# Altium schematic symbol library FPGA_Xilinx_Virtex6.SchLib: 28 symbols (part 1 of 21) (continued)
## XC6VHX255T-FF1155 (continued)
part G pins: AD29 MGTRXN3_104 (io), AD30 MGTRXP3_104 (io), AD33 MGTTXN3_104 (io), AD34 MGTTXP3_104 (io), AE27 MGTREFCLK1P_104 (io), AE28 MGTREFCLK1N_104 (io), AE31 MGTRXN2_104 (io), AE32 MGTRXP2_104 (io), AF29 MGTRXN1_104 (io), AF30 MGTRXP1_104 (io), AF33 MGTTXN2_104 (io), AF34 MGTTXP2_104 (io), AG27 MGTREFCLK0P_104 (io), AG28 MGTREFCLK0N_104 (io), AG31 MGTRXN0_104 (io), AG32 MGTRXP0_104 (io), AH29 MGTRXN3_103 (io), AH30 MGTRXP3_103 (io), AH33 MGTTXN1_104 (io), AH34 MGTTXP1_104 (io), AJ27 MGTREFCLK1P_103 (io), AJ28 MGTREFCLK1N_103 (io), AJ31 MGTRXN2_103 (io), AJ32 MGTRXP2_103 (io), AK29 MGTRXN1_103 (io), AK30 MGTRXP1_103 (io), AK33 MGTTXN0_104 (io), AK34 MGTTXP0_104 (io), AL27 MGTREFCLK0P_103 (io), AL28 MGTREFCLK0N_103 (io), AL31 MGTTXN3_103 (io), AL32 MGTTXP3_103 (io), AM29 MGTRXN0_103 (io), AM30 MGTRXP0_103 (io), AM33 MGTTXN2_103 (io), AM34 MGTTXP2_103 (io), AN31 MGTTXN1_103 (io), AN32 MGTTXP1_103 (io), AP33 MGTTXN0_103 (io), AP34 MGTTXP0_103 (io)
part H pins: AA27 MGTREFCLK1P_105 (io), AA28 MGTREFCLK1N_105 (io), AA31 MGTRXN3_105 (io), AA32 MGTRXP3_105 (io), AB29 MGTRXN2_105 (io), AB30 MGTRXP2_105 (io), AB33 MGTTXN0_105 (io), AB34 MGTTXP0_105 (io), AC27 MGTREFCLK0P_105 (io), AC28 MGTREFCLK0N_105 (io), AC31 MGTRXN0_105 (io), AC32 MGTRXP0_105 (io), AH5 MGTRXP3_113 (io), AH6 MGTRXN3_113 (io), AJ3 MGTRXP2_113 (io), AJ4 MGTRXN2_113 (io), AJ7 MGTREFCLK1N_113 (io), AJ8 MGTREFCLK1P_113 (io), AK5 MGTRXP1_113 (io), AK6 MGTRXN1_113 (io), AL3 MGTTXP3_113 (io), AL4 MGTTXN3_113 (io), AL7 MGTREFCLK0N_113 (io), AL8 MGTREFCLK0P_113 (io), AM1 MGTTXP2_113 (io), AM2 MGTTXN2_113 (io), AM5 MGTRXP0_113 (io), AM6 MGTRXN0_113 (io), AN3 MGTTXP1_113 (io), AN4 MGTTXN1_113 (io), AP1 MGTTXP0_113 (io), AP2 MGTTXN0_113 (io), V33 MGTTXN3_105 (io), V34 MGTTXP3_105 (io), W31 MGTTXN1_105 (io), W32 MGTTXP1_105 (io), Y29 MGTRXN1_105 (io), Y30 MGTRXP1_105 (io), Y33 MGTTXN2_105 (io), Y34 MGTTXP2_105 (io)
part I pins: AA3 MGTRXP3_115 (io), AA4 MGTRXN3_115 (io), AA7 MGTREFCLK1N_115 (io), AA8 MGTREFCLK1P_115 (io), AB1 MGTTXP0_115 (io), AB2 MGTTXN0_115 (io), AB5 MGTRXP2_115 (io), AB6 MGTRXN2_115 (io), AC3 MGTRXP0_115 (io), AC4 MGTRXN0_115 (io), AC7 MGTREFCLK0N_115 (io), AC8 MGTREFCLK0P_115 (io), AD1 MGTTXP3_114 (io), AD2 MGTTXN3_114 (io), AD5 MGTRXP3_114 (io), AD6 MGTRXN3_114 (io), AE3 MGTRXP2_114 (io), AE4 MGTRXN2_114 (io), AE7 MGTREFCLK1N_114 (io), AE8 MGTREFCLK1P_114 (io), AF1 MGTTXP2_114 (io), AF2 MGTTXN2_114 (io), AF5 MGTRXP1_114 (io), AF6 MGTRXN1_114 (io), AG3 MGTRXP0_114 (io), AG4 MGTRXN0_114 (io), AG7 MGTREFCLK0N_114 (io), AG8 MGTREFCLK0P_114 (io), AH1 MGTTXP1_114 (io), AH2 MGTTXN1_114 (io), AK1 MGTTXP0_114 (io), AK2 MGTTXN0_114 (io), V1 MGTTXP3_115 (io), V2 MGTTXN3_115 (io), W3 MGTTXP1_115 (io), W4 MGTTXN1_115 (io), Y1 MGTTXP2_115 (io), Y2 MGTTXN2_115 (io), Y5 MGTRXP1_115 (io), Y6 MGTRXN1_115 (io)
part J pins: D5 MGTRXN2_117 (io), D6 MGTRXP2_117 (io), F1 MGTTXN2_117 (io), F2 MGTTXP2_117 (io), F5 MGTRXN3_117 (io), F6 MGTRXP3_117 (io), G3 MGTTXN3_117 (io), G4 MGTTXP3_117 (io), H1 MGTREFCLKN_117 (io), H2 MGTREFCLKP_117 (io), H5 MGTRXN1_117 (io), H6 MGTRXP1_117 (io), J3 MGTTXN1_117 (io), J4 MGTTXP1_117 (io), J8 MGTRBIAS_117 (io), K1 MGTTXN0_117 (io), K2 MGTTXP0_117 (io), K5 MGTRXN0_117 (io), K6 MGTRXP0_117 (io), L3 MGTTXN2_116 (io), L4 MGTTXP2_116 (io), L8 MGTRBIAS_116 (io), M1 MGTTXN3_116 (io), M2 MGTTXP3_116 (io), M5 MGTRXN3_116 (io), M6 MGTRXP3_116 (io), N3 MGTRXN2_116 (io), N4 MGTRXP2_116 (io), P1 MGTTXN1_116 (io), P2 MGTTXP1_116 (io), P5 MGTREFCLKN_116 (io), P6 MGTREFCLKP_116 (io), R3 MGTRXN1_116 (io), R4 MGTRXP1_116 (io), T1 MGTTXN0_116 (io), T2 MGTTXP0_116 (io), U3 MGTRXN0_116 (io), U4 MGTRXP0_116 (io)
part K pins: A3 MGTTXN2_118 (io), A4 MGTTXP2_118 (io), A7 MGTRXN2_118 (io), A8 MGTRXP2_118 (io), B1 MGTTXN3_118 (io), B2 MGTTXP3_118 (io), B5 MGTRXN3_118 (io), B6 MGTRXP3_118 (io), C3 MGTREFCLKN_118 (io), C4 MGTREFCLKP_118 (io), C7 MGTRXN1_118 (io), C8 MGTRXP1_118 (io), D1 MGTTXN1_118 (io), D2 MGTTXP1_118 (io), E3 MGTTXN0_118 (io), E4 MGTTXP0_118 (io), E7 MGTRXN0_118 (io), E8 MGTRXP0_118 (io), G8 MGTRBIAS_118 (io)
part L pins: AA6 MGTAVCC_R (power), AA29 MGTAVCC_L (power), AB7 MGTAVCC_R (power), AB28 MGTAVCC_L (power), AC2 MGTAVTT_R (power), AC33 MGTAVTT_L (power), AD3 MGTAVTT_R (power), AD7 MGTAVCC_R (power), AD28 MGTAVCC_L (power), AD32 MGTAVTT_L (power), AF7 MGTAVCC_R (power), AF28 MGTAVCC_L (power), AG2 MGTAVTT_R (power), AG33 MGTAVTT_L (power), AH3 MGTAVTT_R (power), AH7 MGTAVCC_R (power), AH28 MGTAVCC_L (power), AH32 MGTAVTT_L (power), AK7 MGTAVCC_R (power), AK28 MGTAVCC_L (power), AL2 MGTAVTT_R (power), AL6 MGTAVCC_R (power), AL29 MGTAVCC_L (power), AL33 MGTAVTT_L (power), AM3 MGTAVTT_R (power), AM7 MGTAVCC_R (power), AM28 MGTAVCC_L (power), AM32 MGTAVTT_L (power), AP5 MGTRREF_115 (power), AP6 MGTAVTTRCAL_115 (power), AP29 MGTAVTTRCAL_105 (power), AP30 MGTRREF_105 (power), W2 MGTAVTT_R (power), W33 MGTAVTT_L (power), Y3 MGTAVTT_R (power), Y32 MGTAVTT_L (power)
part M pins: A1 MGTHAGND (power), A2 MGTHAGND (power), A5 MGTHAGND (power), A6 MGTHAVCCRX (power), B3 MGTHAGND (power), B4 MGTHAVCC (power), B7 MGTHAGND (power), B8 MGTHAVCCRX (power), C1 MGTHAGND (power), C2 MGTHAVTT (power), C5 MGTHAGND (power), C6 MGTHAVCCRX (power), D3 MGTHAGND (power), D4 MGTHAVCC (power), D7 MGTHAGND (power), D8 MGTHAVCCRX (power), E1 MGTHAGND (power), E2 MGTHAGND (power), E5 MGTHAGND (power), E6 MGTHAVCCRX (power), F3 MGTHAGND (power), F4 MGTHAVCC (power), F7 MGTHAGND (power), F8 MGTHAVCCPLL (power), G1 MGTHAGND (power), G2 MGTHAVTT (power), G5 MGTHAGND (power), G6 MGTHAVCC (power), G7 MGTHAGND (power), H3 MGTHAGND (power), H4 MGTHAVCC (power), H7 MGTHAGND (power), H8 MGTHAVCCPLL (power), J1 MGTHAGND (power), J2 MGTHAGND (power), J5 MGTHAGND (power), J6 MGTHAVCCRX (power), J7 MGTHAGND (power), K3 MGTHAGND (power), K4 MGTHAVCC (power), K7 MGTHAGND (power), K8 MGTHAVCCPLL (power), L1 MGTHAGND (power), L2 MGTHAVTT (power), L5 MGTHAGND (power), L6 MGTHAVCCRX (power), M3 MGTHAGND (power), M4 MGTHAVCC (power), M7 MGTHAGND (power), M8 MGTHAGND (power), N1 MGTHAGND (power), N2 MGTHAGND (power), N5 MGTHAGND (power), N6 MGTHAVCCRX (power), P3 MGTHAGND (power), P4 MGTHAVCC (power), P7 MGTHAGND (power), R1 MGTHAGND (power), R2 MGTHAVTT (power), R5 MGTHAGND (power), R6 MGTHAVCC (power), T3 MGTHAGND (power), T4 MGTHAVCC (power), T5 MGTHAGND (power), T6 MGTHAGND (power), U1 MGTHAGND (power), U2 MGTHAGND (power), U5 MGTHAGND (power)
part N pins: P10 VCCO_0 (power), P25 M1_0 (io), R25 M2_0 (io), T8 DIN_0 (io), T9 INIT_B_0 (io), T25 M0_0 (io), U8 DONE_0 (io), U9 VCCO_0 (power), U10 HSWAPEN_0 (io), U17 VREFN_0 (io), U18 VP_0 (io), U25 PROGRAM_B_0 (io), V9 TDI_0 (io), V17 VN_0 (io), V18 VREFP_0 (io), W8 TCK_0 (io), W9 TDO_0 (io), W10 TMS_0 (io), W17 DXN_0 (io), W18 DXP_0 (io), W25 CSI_B_0 (io), W26 DOUT_BUSY_0 (io), Y10 CCLK_0 (io), Y25 RDWR_B_0 (io)
part O pins: A9 GND (power), A16 GND (power), A26 GND (power), AA10 VCCAUX (power), AA12 VCCINT (power), AA14 VCCINT (power), AA16 VCCINT (power), AA18 VCCINT (power), AA20 VCCINT (power), AA22 VCCINT (power), AA24 VCCAUX (power), AA25 VFS_0 (power), AB13 VCCINT (power), AB15 VCCINT (power), AB17 VCCINT (power), AB19 VCCINT (power), AB21 VCCINT (power), AB23 VCCAUX (power), B9 GND (power), B13 GND (power), B23 GND (power), B33 GND (power), C9 GND (power), C10 GND (power), C20 GND (power), C30 GND (power), D9 GND (power), D17 GND (power), D27 GND (power), E9 GND (power), E14 GND (power), E24 GND (power), E34 GND (power), F9 GND (power), F11 GND (power), F21 GND (power), F31 GND (power), G9 GND (power), G18 GND (power), G28 GND (power), H9 GND (power), H15 GND (power), H25 GND (power), J9 GND (power), J12 GND (power), J22 GND (power), J32 GND (power), K9 GND (power), K19 GND (power), K29 GND (power), L9 GND (power), L16 GND (power), L26 GND (power), M9 GND (power), M13 GND (power), M23 GND (power), M33 GND (power), N9 GND (power), N10 GND (power), N12 VCCINT (power), N13 GND (power), N14 VCCINT (power), N15 GND (power), N16 VCCINT (power), N18 VCCINT (power), N19 GND (power), N20 VCCINT (power), N21 GND (power), N22 VCCINT (power), N23 GND (power), N24 VCCAUX (power), N30 GND (power), P8 GND (power), P9 GND (power), P11 VCCAUX (power), P12 GND (power), P13 VCCINT (power), P14 GND (power), P15 VCCINT (power), P16 GND (power), P17 VCCINT (power), P18 GND (power), P19 VCCINT (power), P20 GND (power), P21 VCCINT (power), P22 GND (power), P23 VCCINT (power), P24 GND (power), P27 GND (power), R7 GND (power), R8 GND (power), R9 VBATT_0 (power), R10 VCCAUX (power), R11 GND (power), R12 VCCINT (power), R13 GND (power), R14 VCCINT (power), R15 GND (power), R16 VCCINT (power), R17 GND (power), R18 VCCINT (power), R19 GND (power), R20 VCCINT (power), R21 GND (power), R22 VCCINT (power), R23 GND (power), R24 VCCAUX (power), R34 GND (power), T7 GND (power), T10 GND (power), T11 VCCAUX (power), T12 GND (power), T13 VCCINT (power), T14 GND (power), T15 VCCINT (power), T16 GND (power), T17 AVSS_0 (power), T18 AVDD_0 (power), T19 VCCINT (power), T20 GND (power), T21 VCCINT (power), T22 GND (power), T23 VCCINT (power), T24 GND (power), T31 GND (power), U6 GND (power), U7 GND (power), U11 GND (power), U12 VCCINT (power), U13 GND (power), U14 VCCINT (power), U15 GND (power), U16 VCCINT (power), U19 GND (power), U20 VCCINT (power), U21 GND (power), U22 VCCINT (power), U23 GND (power), U24 VCCAUX (power), U28 GND (power), U32 GND (power), U33 GND (power), U34 GND (power), V3 GND (power), V4 GND (power), V5 GND (power), V6 GND (power), V7 GND (power), V8 GND (power), V10 GND (power), V11 VCCAUX (power), V12 GND (power), V13 VCCINT (power), V14 GND (power), V15 VCCINT (power), V19 VCCINT (power), V21 VCCINT (power), V23 VCCINT (power), W12 VCCINT (power), W14 VCCINT (power), W16 VCCINT (power), W20 VCCINT (power), W22 VCCINT (power), W24 VCCAUX (power), Y11 VCCAUX (power), Y13 VCCINT (power), Y15 VCCINT (power), Y17 VCCINT (power), Y19 VCCINT (power), Y21 VCCINT (power), Y23 VCCINT (power)
part P pins: AA1 GND (power), AA2 GND (power), AA5 GND (power), AA9 GND (power), AA11 GND (power), AA13 GND (power), AA15 GND (power), AA17 GND (power), AA19 GND (power), AA21 GND (power), AA23 GND (power), AA26 GND (power), AA30 GND (power), AA33 GND (power), AA34 GND (power), AB3 GND (power), AB4 GND (power), AB8 GND (power), AB9 GND (power), AB12 GND (power), AB14 GND (power), AB16 GND (power), AB18 GND (power), AB20 GND (power), AB22 GND (power), AB25 GND (power), AB26 GND (power), AB27 GND (power), AB31 GND (power), AB32 GND (power), AC1 GND (power), AC5 GND (power), AC6 GND (power), AC9 GND (power), AC10 GND (power), AC20 GND (power), AC26 GND (power), AC29 GND (power), AC30 GND (power), AC34 GND (power), AD4 GND (power), AD8 GND (power), AD9 GND (power), AD17 GND (power), AD26 GND (power), AD27 GND (power), AD31 GND (power), AE1 GND (power), AE2 GND (power), AE5 GND (power), AE6 GND (power), AE9 GND (power), AE14 GND (power), AE24 GND (power), AE26 GND (power), AE29 GND (power), AE30 GND (power), AE33 GND (power), AE34 GND (power), AF3 GND (power), AF4 GND (power), AF8 GND (power), AF9 GND (power), AF11 GND (power), AF21 GND (power), AF26 GND (power), AF27 GND (power), AF31 GND (power), AF32 GND (power), AG1 GND (power), AG5 GND (power), AG6 GND (power), AG9 GND (power), AG18 GND (power), AG26 GND (power), AG29 GND (power), AG30 GND (power), AG34 GND (power), AH4 GND (power), AH8 GND (power), AH9 GND (power), AH15 GND (power), AH25 GND (power), AH26 GND (power), AH27 GND (power), AH31 GND (power), AJ1 GND (power), AJ2 GND (power), AJ5 GND (power), AJ6 GND (power), AJ9 GND (power), AJ12 GND (power), AJ22 GND (power), AJ26 GND (power), AJ29 GND (power), AJ30 GND (power), AJ33 GND (power), AJ34 GND (power), AK3 GND (power), AK4 GND (power), AK8 GND (power), AK9 GND (power), AK19 GND (power), AK26 GND (power), AK27 GND (power), AK31 GND (power), AK32 GND (power), AL1 GND (power), AL5 GND (power), AL9 GND (power), AL16 GND (power), AL26 GND (power), AL30 GND (power), AL34 GND (power), AM4 GND (power), AM8 GND (power), AM9 GND (power), AM13 GND (power), AM23 GND (power), AM26 GND (power), AM27 GND (power), AM31 GND (power), AN1 GND (power), AN2 GND (power), AN5 GND (power), AN6 GND (power), AN7 GND (power), AN8 GND (power), AN10 GND (power), AN20 GND (power), AN27 GND (power), AN28 GND (power), AN29 GND (power), AN30 GND (power), AN33 GND (power), AN34 GND (power), AP3 GND (power), AP4 GND (power), AP7 GND (power), AP8 GND (power), AP17 GND (power), AP27 GND (power), AP28 GND (power), AP31 GND (power), AP32 GND (power), V16 GND (power), V20 GND (power), V22 GND (power), V24 GND (power), V25 GND (power), V30 GND (power), V31 GND (power), V32 GND (power), W1 GND (power), W5 GND (power), W6 GND (power), W7 GND (power), W11 GND (power), W13 GND (power), W15 GND (power), W19 GND (power), W21 GND (power), W23 GND (power), W28 GND (power), W29 GND (power), W30 GND (power), W34 GND (power), Y4 GND (power), Y7 GND (power), Y8 GND (power), Y9 GND (power), Y12 GND (power), Y14 GND (power), Y16 GND (power), Y18 GND (power), Y20 GND (power), Y22 GND (power), Y24 GND (power), Y26 GND (power), Y27 GND (power), Y28 GND (power), Y31 GND (power)

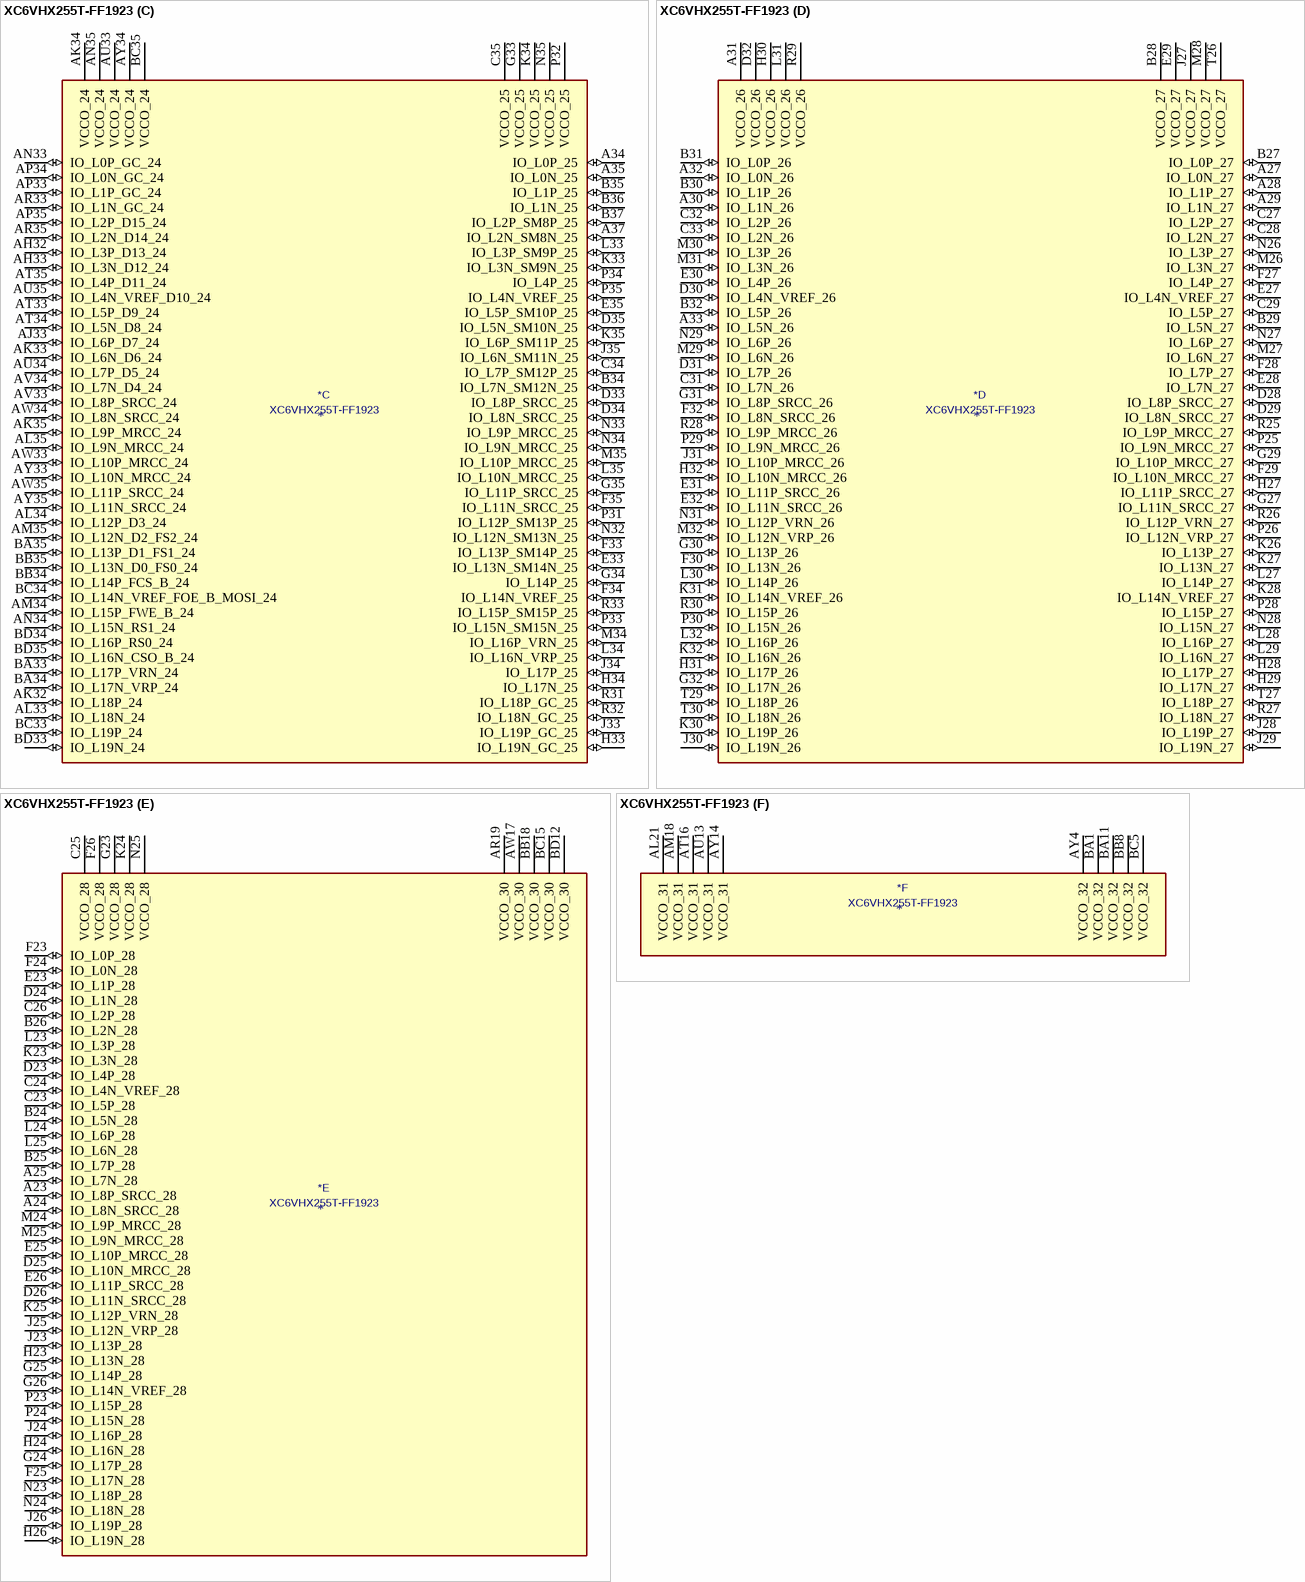
[diagram p6: symbol XC6VHX255T-FF1923]

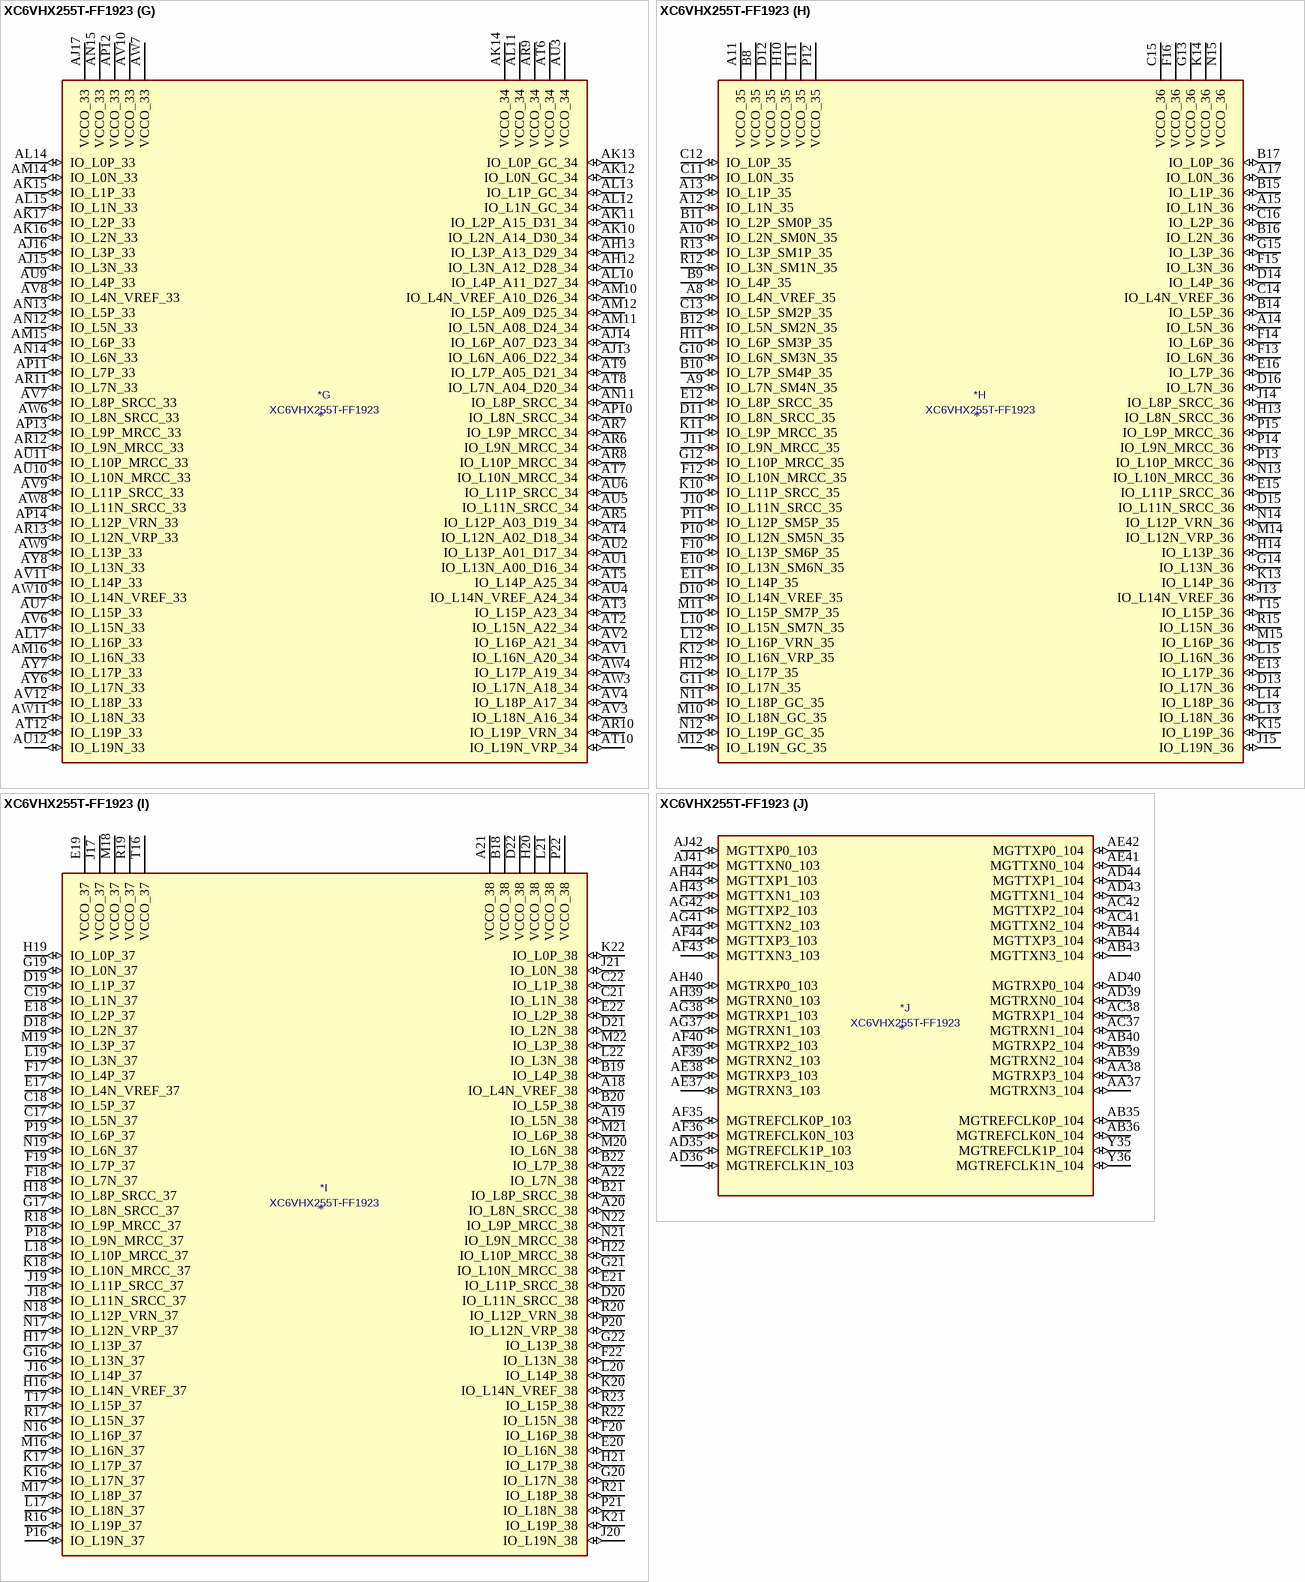
[diagram p7: symbol XC6VHX255T-FF1923]

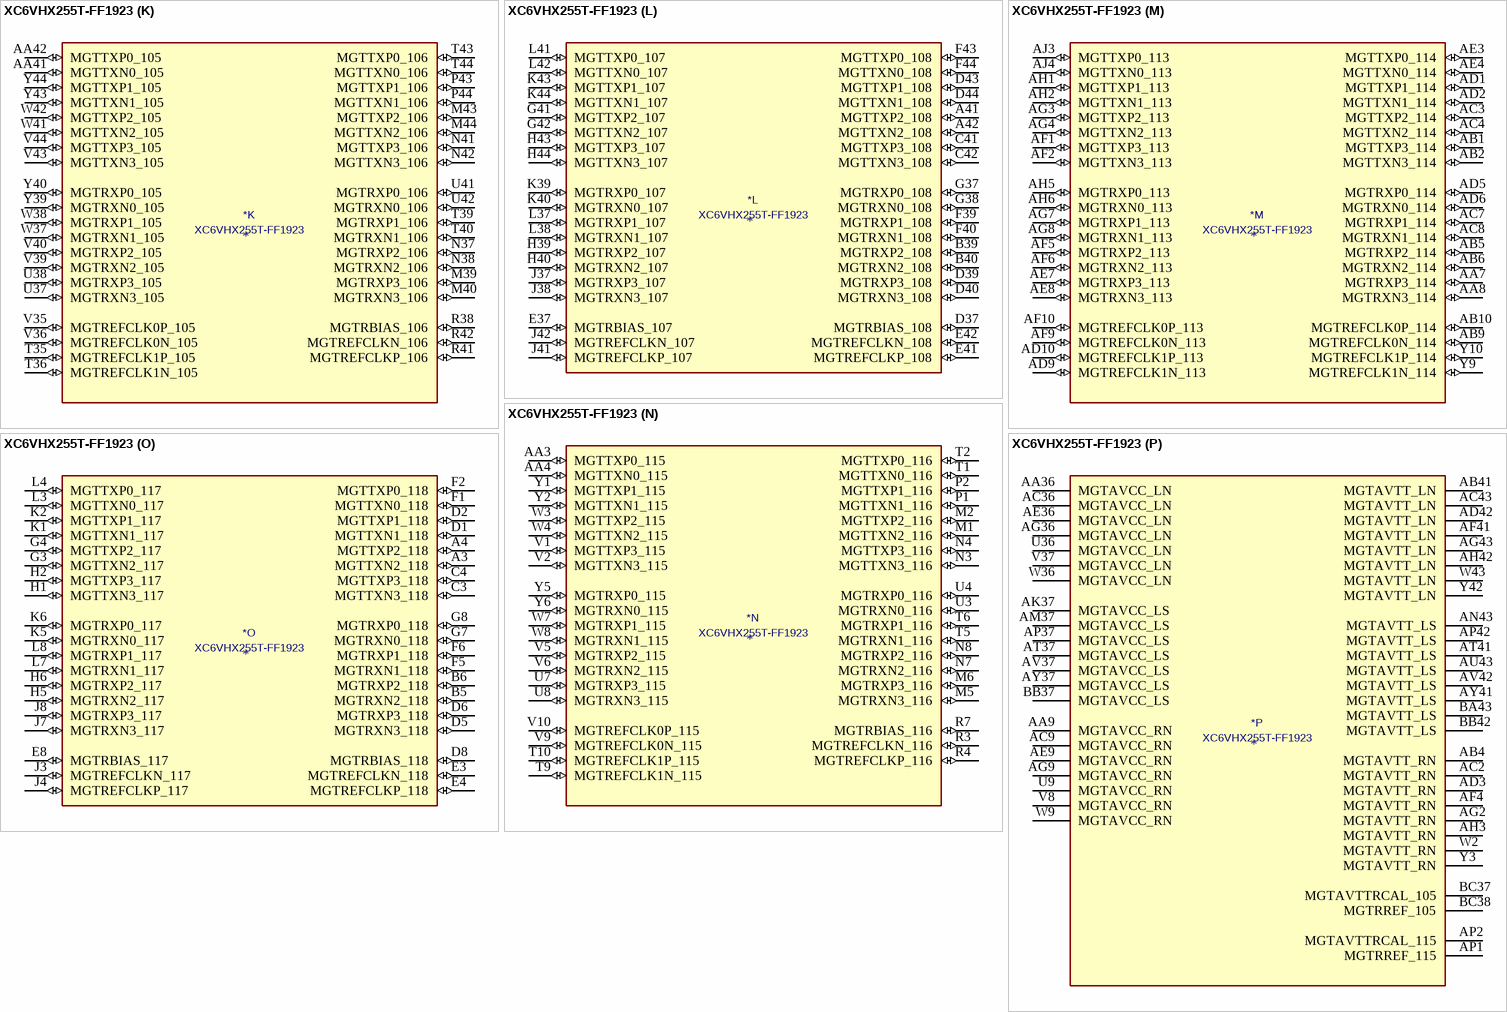
[diagram p8: symbol XC6VHX255T-FF1923]

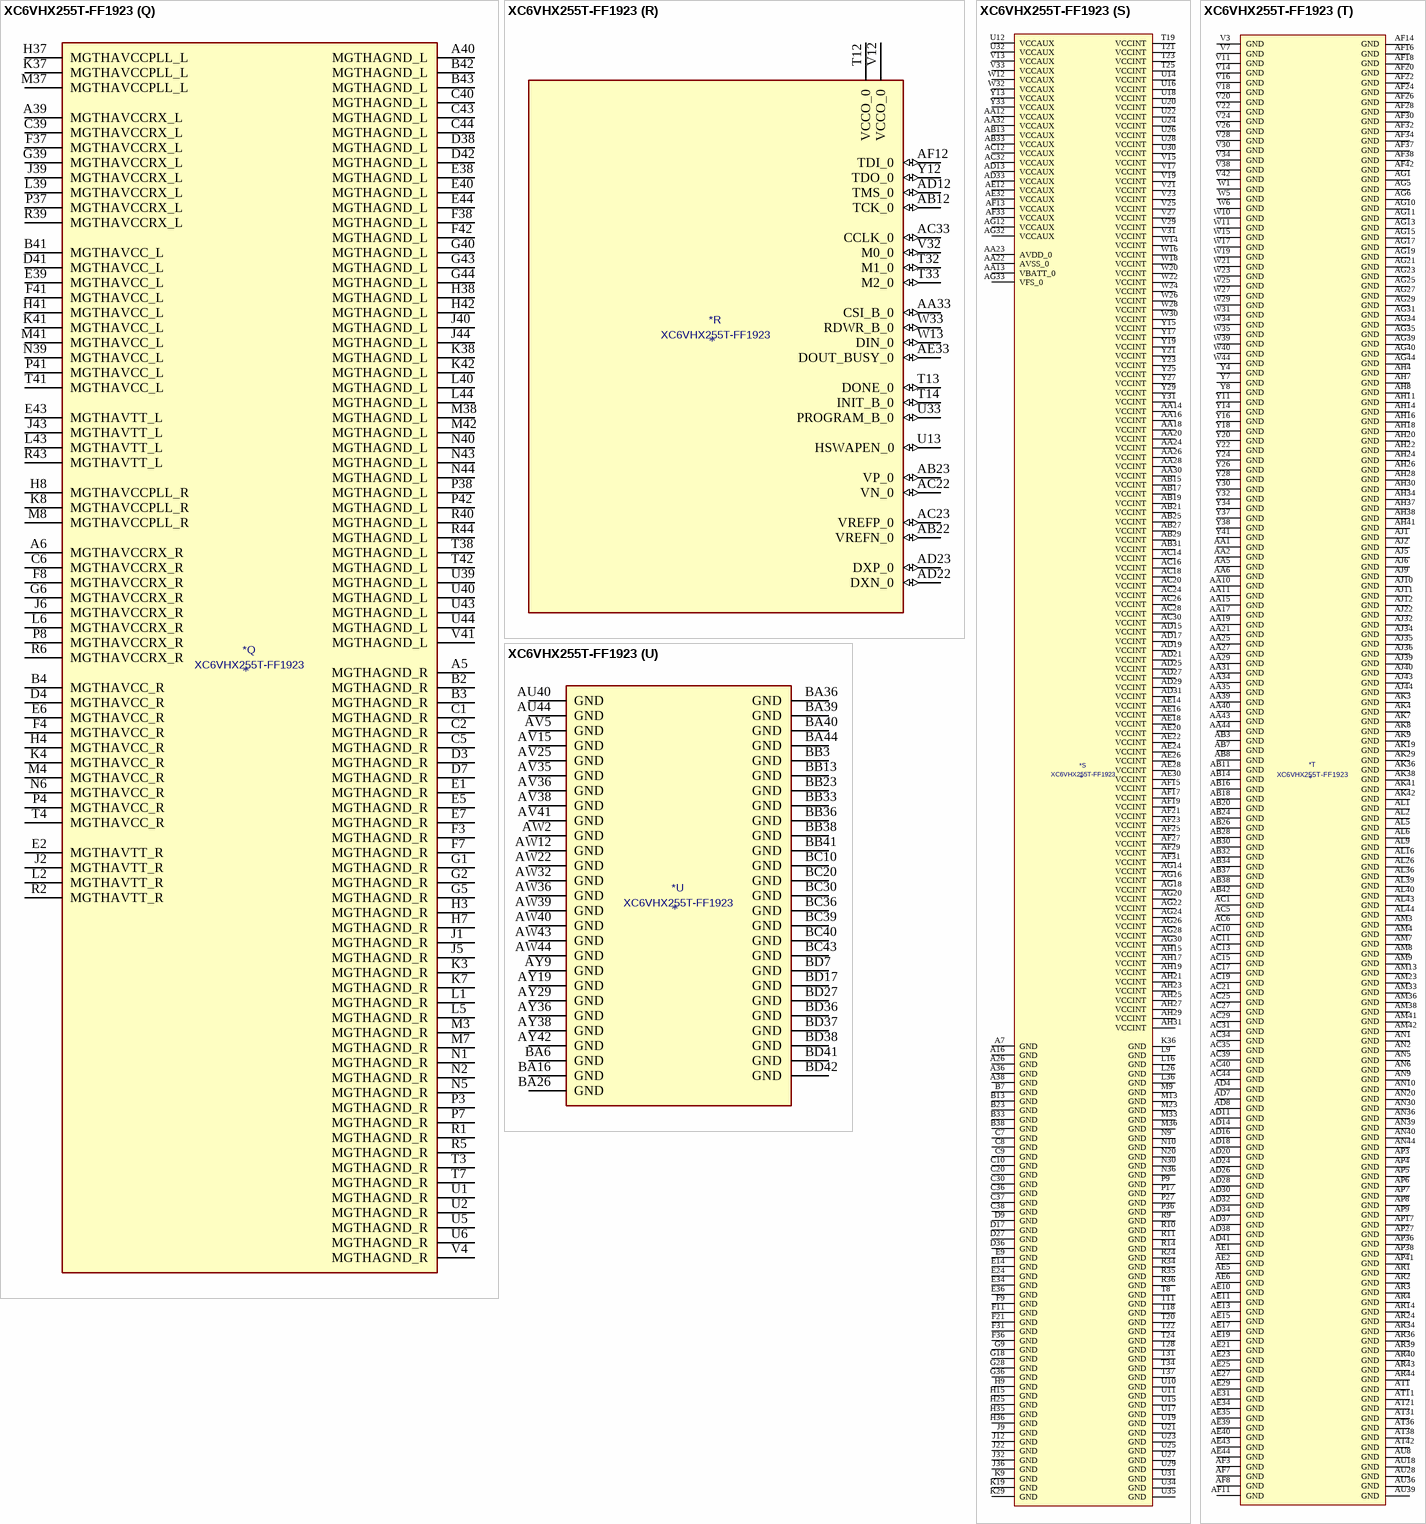
[diagram p9: symbol XC6VHX255T-FF1923]